# Altium schematic symbol library TI Power Management Shunt Voltage Reference.SchLib: 1526 symbols (part 1 of 18) (continued)
## LM336DE4-2-5
designator U?
Integrated Reference Circuit, 2.5 V, 10 ppm / degC, 10 mA, 0 to 70 degC, 8-pin SOIC (D), Green (RoHS & no Sb/Br); Manufacturer: Texas Instruments; PartNumber: LM336DE4-2-5; Initial Accuracy @ 25/deg C(%): 4; Iout/Iz(Max)(mA): 10; Min Iz for Regulation(uA): 400; Rating: Catalog; SubFamily: Shunt Voltage Reference; Temp Coeff(Max)(ppm/ degree C): 34; VO(V): 2.49; DatasheetVersion: SLVS063E; PackageVersion: 4040047-3/M; PackageReference: D8; PackageDescription: 8-Pin Plastic Small Outline, Body 4.9 x 3.9 mm, Pitch 1.27 mm; Supplier 1: Digi-Key; Supplier Part Number 1: LM336DE4-2-5-ND; Supplier 2: Mouser; Supplier Part Number 2: 595-LM336DE4-2-5; Eco-Plan: Green (RoHS & no Sb/Br); Temp Coeff(Typ)(ppm/ degree C): 10; Mounting Technology: Surface Mount; Code_JEDEC: MS-012; ComponentLink1Description: Manufacturer URL; ComponentLink1URL: http://www.ti.com/; ComponentLink2Description: Datasheet; ComponentLink2URL: http://www.ti.com/general/docs/lit/getliterature.tsp?genericPartNumber=LM336-2.5&fileType=pdf; ComponentLink3Description: Package Specification; ComponentLink3URL: http://www.ti.com/litv/pdf/msoi002j
footprint TI-D8_N (SOIC, 8-Leads, Body 4.9x3.9mm, Pitch 1.27mm, IPC Medium Density)
part A pins: 4 ANODE, 5 ADJ (in), 8 CATHODE
part B pins: 1 NC "No internal connection", 2 NC "No internal connection", 3 NC "No internal connection", 6 NC "No internal connection", 7 NC "No internal connection"

## LM336DG4-2-5
designator U?
Integrated Reference Circuit, 2.5 V, 10 ppm / degC, 10 mA, 0 to 70 degC, 8-pin SOIC (D), Green (RoHS & no Sb/Br); Manufacturer: Texas Instruments; PartNumber: LM336DG4-2-5; Initial Accuracy @ 25/deg C(%): 4; Iout/Iz(Max)(mA): 10; Min Iz for Regulation(uA): 400; Rating: Catalog; SubFamily: Shunt Voltage Reference; Temp Coeff(Max)(ppm/ degree C): 34; VO(V): 2.49; DatasheetVersion: SLVS063E; PackageVersion: 4040047-3/M; PackageReference: D8; PackageDescription: 8-Pin Plastic Small Outline, Body 4.9 x 3.9 mm, Pitch 1.27 mm; Supplier 1: Digi-Key; Supplier Part Number 1: LM336DG4-2-5-ND; Supplier 2: Newark; Supplier Part Number 2: 41M3419; Supplier 3: Mouser; Supplier Part Number 3: 595-LM336DG4-2-5; Eco-Plan: Green (RoHS & no Sb/Br); Temp Coeff(Typ)(ppm/ degree C): 10; Mounting Technology: Surface Mount; Code_JEDEC: MS-012; ComponentLink1Description: Manufacturer URL; ComponentLink1URL: http://www.ti.com/; ComponentLink2Description: Datasheet; ComponentLink2URL: http://www.ti.com/general/docs/lit/getliterature.tsp?genericPartNumber=LM336-2.5&fileType=pdf; ComponentLink3Description: Package Specification; ComponentLink3URL: http://www.ti.com/litv/pdf/msoi002j
footprint TI-D8_N (SOIC, 8-Leads, Body 4.9x3.9mm, Pitch 1.27mm, IPC Medium Density)
part A pins: 4 ANODE, 5 ADJ (in), 8 CATHODE
part B pins: 1 NC "No internal connection", 2 NC "No internal connection", 3 NC "No internal connection", 6 NC "No internal connection", 7 NC "No internal connection"

## LM336DR-2-5
designator U?
Integrated Reference Circuit, 2.5 V, 10 ppm / degC, 10 mA, 0 to 70 degC, 8-pin SOIC (D), Green (RoHS & no Sb/Br); Manufacturer: Texas Instruments; PartNumber: LM336DR-2-5; Initial Accuracy @ 25/deg C(%): 4; Iout/Iz(Max)(mA): 10; Min Iz for Regulation(uA): 400; Rating: Catalog; SubFamily: Shunt Voltage Reference; Temp Coeff(Max)(ppm/ degree C): 34; VO(V): 2.49; DatasheetVersion: SLVS063E; PackageVersion: 4040047-3/M; PackageReference: D8; PackageDescription: 8-Pin Plastic Small Outline, Body 4.9 x 3.9 mm, Pitch 1.27 mm; Supplier 1: Digi-Key; Supplier Part Number 1: LM336DR-2-5-ND; Supplier 2: Mouser; Supplier Part Number 2: 595-LM336DR-2-5; Eco-Plan: Green (RoHS & no Sb/Br); Temp Coeff(Typ)(ppm/ degree C): 10; Mounting Technology: Surface Mount; Code_JEDEC: MS-012; ComponentLink1Description: Manufacturer URL; ComponentLink1URL: http://www.ti.com/; ComponentLink2Description: Datasheet; ComponentLink2URL: http://www.ti.com/general/docs/lit/getliterature.tsp?genericPartNumber=LM336-2.5&fileType=pdf; ComponentLink3Description: Package Specification; ComponentLink3URL: http://www.ti.com/litv/pdf/msoi002j
footprint TI-D8_N (SOIC, 8-Leads, Body 4.9x3.9mm, Pitch 1.27mm, IPC Medium Density)
part A pins: 4 ANODE, 5 ADJ (in), 8 CATHODE
part B pins: 1 NC "No internal connection", 2 NC "No internal connection", 3 NC "No internal connection", 6 NC "No internal connection", 7 NC "No internal connection"

## LM336DRE4-2-5
designator U?
Integrated Reference Circuit, 2.5 V, 10 ppm / degC, 10 mA, 0 to 70 degC, 8-pin SOIC (D), Green (RoHS & no Sb/Br); Manufacturer: Texas Instruments; PartNumber: LM336DRE4-2-5; Initial Accuracy @ 25/deg C(%): 4; Iout/Iz(Max)(mA): 10; Min Iz for Regulation(uA): 400; Rating: Catalog; SubFamily: Shunt Voltage Reference; Temp Coeff(Max)(ppm/ degree C): 34; VO(V): 2.49; DatasheetVersion: SLVS063E; PackageVersion: 4040047-3/M; PackageReference: D8; PackageDescription: 8-Pin Plastic Small Outline, Body 4.9 x 3.9 mm, Pitch 1.27 mm; Supplier 1: Digi-Key; Supplier Part Number 1: LM336DRE4-2-5-ND; Supplier 2: Mouser; Supplier Part Number 2: 595-LM336DRE4-2-5; Eco-Plan: Green (RoHS & no Sb/Br); Temp Coeff(Typ)(ppm/ degree C): 10; Mounting Technology: Surface Mount; Code_JEDEC: MS-012; ComponentLink1Description: Manufacturer URL; ComponentLink1URL: http://www.ti.com/; ComponentLink2Description: Datasheet; ComponentLink2URL: http://www.ti.com/general/docs/lit/getliterature.tsp?genericPartNumber=LM336-2.5&fileType=pdf; ComponentLink3Description: Package Specification; ComponentLink3URL: http://www.ti.com/litv/pdf/msoi002j
footprint TI-D8_N (SOIC, 8-Leads, Body 4.9x3.9mm, Pitch 1.27mm, IPC Medium Density)
part A pins: 4 ANODE, 5 ADJ (in), 8 CATHODE
part B pins: 1 NC "No internal connection", 2 NC "No internal connection", 3 NC "No internal connection", 6 NC "No internal connection", 7 NC "No internal connection"

## LM336DRG4-2-5
designator U?
Integrated Reference Circuit, 2.5 V, 10 ppm / degC, 10 mA, 0 to 70 degC, 8-pin SOIC (D), Green (RoHS & no Sb/Br); Manufacturer: Texas Instruments; PartNumber: LM336DRG4-2-5; Initial Accuracy @ 25/deg C(%): 4; Iout/Iz(Max)(mA): 10; Min Iz for Regulation(uA): 400; Rating: Catalog; SubFamily: Shunt Voltage Reference; Temp Coeff(Max)(ppm/ degree C): 34; VO(V): 2.49; DatasheetVersion: SLVS063E; PackageVersion: 4040047-3/M; PackageReference: D8; PackageDescription: 8-Pin Plastic Small Outline, Body 4.9 x 3.9 mm, Pitch 1.27 mm; Supplier 1: Digi-Key; Supplier Part Number 1: LM336DRG4-2-5-ND; Supplier 2: Newark; Supplier Part Number 2: 41M3420; Supplier 3: Mouser; Supplier Part Number 3: 595-LM336DRG4-2-5; Eco-Plan: Green (RoHS & no Sb/Br); Temp Coeff(Typ)(ppm/ degree C): 10; Mounting Technology: Surface Mount; Code_JEDEC: MS-012; ComponentLink1Description: Manufacturer URL; ComponentLink1URL: http://www.ti.com/; ComponentLink2Description: Datasheet; ComponentLink2URL: http://www.ti.com/general/docs/lit/getliterature.tsp?genericPartNumber=LM336-2.5&fileType=pdf; ComponentLink3Description: Package Specification; ComponentLink3URL: http://www.ti.com/litv/pdf/msoi002j
footprint TI-D8_N (SOIC, 8-Leads, Body 4.9x3.9mm, Pitch 1.27mm, IPC Medium Density)
part A pins: 4 ANODE, 5 ADJ (in), 8 CATHODE
part B pins: 1 NC "No internal connection", 2 NC "No internal connection", 3 NC "No internal connection", 6 NC "No internal connection", 7 NC "No internal connection"

## LM336LP-2-5
designator U?
Integrated Reference Circuit, 2.5-V, 10 ppm / degC, 10 mA, 0 to 70 degC, 3-pin TO-92 (LP), Pb-Free (RoHS); Manufacturer: Texas Instruments; PartNumber: LM336LP-2-5; Initial Accuracy @ 25/deg C(%): 4; Iout/Iz(Max)(mA): 10; Min Iz for Regulation(uA): 400; Rating: Catalog; SubFamily: Shunt Voltage Reference; Temp Coeff(Max)(ppm/ degree C): 34; VO(V): 2.49; DatasheetVersion: SLVS063E; PackageVersion: 4040001-2/C; PackageReference: LP3; PackageDescription: Plastic Cylindrical Package, Formed Lead Option (TO-92); Supplier 1: Digi-Key; Supplier Part Number 1: 296-31365-ND; Supplier 2: Newark; Supplier Part Number 2: 06F9356; Supplier 3: Mouser; Supplier Part Number 3: 595-LM336LP-2-5; Eco-Plan: Pb-Free (RoHS); Temp Coeff(Typ)(ppm/ degree C): 10; Mounting Technology: Through Hole; Code_JEDEC: TO-226; ComponentLink1Description: Manufacturer URL; ComponentLink1URL: http://www.ti.com/; ComponentLink2Description: Datasheet; ComponentLink2URL: http://www.ti.com/general/docs/lit/getliterature.tsp?genericPartNumber=LM336-2.5&fileType=pdf; ComponentLink3Description: Package Specification; ComponentLink3URL: http://www.ti.com/litv/pdf/msot002a
footprint TI-LP3 (TO, Flat Index; 3 In-Line, Formed Axial Leads; Body Dia. 4.8mm; Leads 0.56 x 0.41 mm (max))
pins: 1 ADJ (in), 2 CATHODE, 3 ANODE

## LM336LPE3-2-5
designator U?
Integrated Reference Circuit, 2.49 V, 10 ppm / degC, 10 mA, 0 to 70 degC, 3-pin TO-92 (LP), Pb-Free (RoHS); Manufacturer: Texas Instruments; PartNumber: LM336LPE3-2-5; Initial Accuracy @ 25/deg C(%): 4; Iout/Iz(Max)(mA): 10; Min Iz for Regulation(uA): 400; Rating: Catalog; SubFamily: Shunt Voltage Reference; Temp Coeff(Max)(ppm/ degree C): 34; VO(V): 2.49; DatasheetVersion: SLVS063E; PackageVersion: 4040001-2/C; PackageReference: LP3; PackageDescription: Plastic Cylindrical Package, Formed Lead Option (TO-92); Supplier 1: Digi-Key; Supplier Part Number 1: LM336LPE3-2-5-ND; Supplier 2: Mouser; Supplier Part Number 2: 595-LM336LPE3-2-5; Eco-Plan: Pb-Free (RoHS); Temp Coeff(Typ)(ppm/ degree C): 10; Mounting Technology: Through Hole; Code_JEDEC: TO-226; ComponentLink1Description: Manufacturer URL; ComponentLink1URL: http://www.ti.com/; ComponentLink2Description: Datasheet; ComponentLink2URL: http://www.ti.com/general/docs/lit/getliterature.tsp?genericPartNumber=LM336-2.5&fileType=pdf; ComponentLink3Description: Package Specification; ComponentLink3URL: http://www.ti.com/litv/pdf/msot002a
footprint TI-LP3 (TO, Flat Index; 3 In-Line, Formed Axial Leads; Body Dia. 4.8mm; Leads 0.56 x 0.41 mm (max))
pins: 1 ADJ (in), 2 CATHODE, 3 ANODE

## LM336LPR-2-5
designator U?
Integrated Reference Circuit, 2.5 V, 10 ppm / degC, 10 mA, 0 to 70 degC, 3-pin TO-92 (LP), Pb-Free (RoHS); Manufacturer: Texas Instruments; PartNumber: LM336LPR-2-5; Iout/Iz(Max)(mA): 10; Min Iz for Regulation(uA): 400; Rating: Catalog; SubFamily: Shunt Voltage Reference; Temp Coeff(Max)(ppm/ degree C): 34; DatasheetVersion: SLVS063E; PackageVersion: 4040001-2/C; PackageReference: LP3; PackageDescription: Plastic Cylindrical Package, Formed Lead Option (TO-92); Supplier 1: Digi-Key; Supplier Part Number 1: LM336LPR-2-5-ND; Supplier 2: Newark; Supplier Part Number 2: 82H4040; Supplier 3: Mouser; Supplier Part Number 3: 595-LM336LPR-2-5; Eco-Plan: Pb-Free (RoHS); Temp Coeff(Typ)(ppm/ degree C): 10; Mounting Technology: Through Hole; Code_JEDEC: TO-226; ComponentLink1Description: Manufacturer URL; ComponentLink1URL: http://www.ti.com/; ComponentLink2Description: Datasheet; ComponentLink2URL: http://www.ti.com/general/docs/lit/getliterature.tsp?genericPartNumber=LM336-2.5&fileType=pdf; ComponentLink3Description: Package Specification; ComponentLink3URL: http://www.ti.com/litv/pdf/msot002a
footprint TI-LP3 (TO, Flat Index; 3 In-Line, Formed Axial Leads; Body Dia. 4.8mm; Leads 0.56 x 0.41 mm (max))
pins: 1 ADJ (in), 2 CATHODE, 3 ANODE

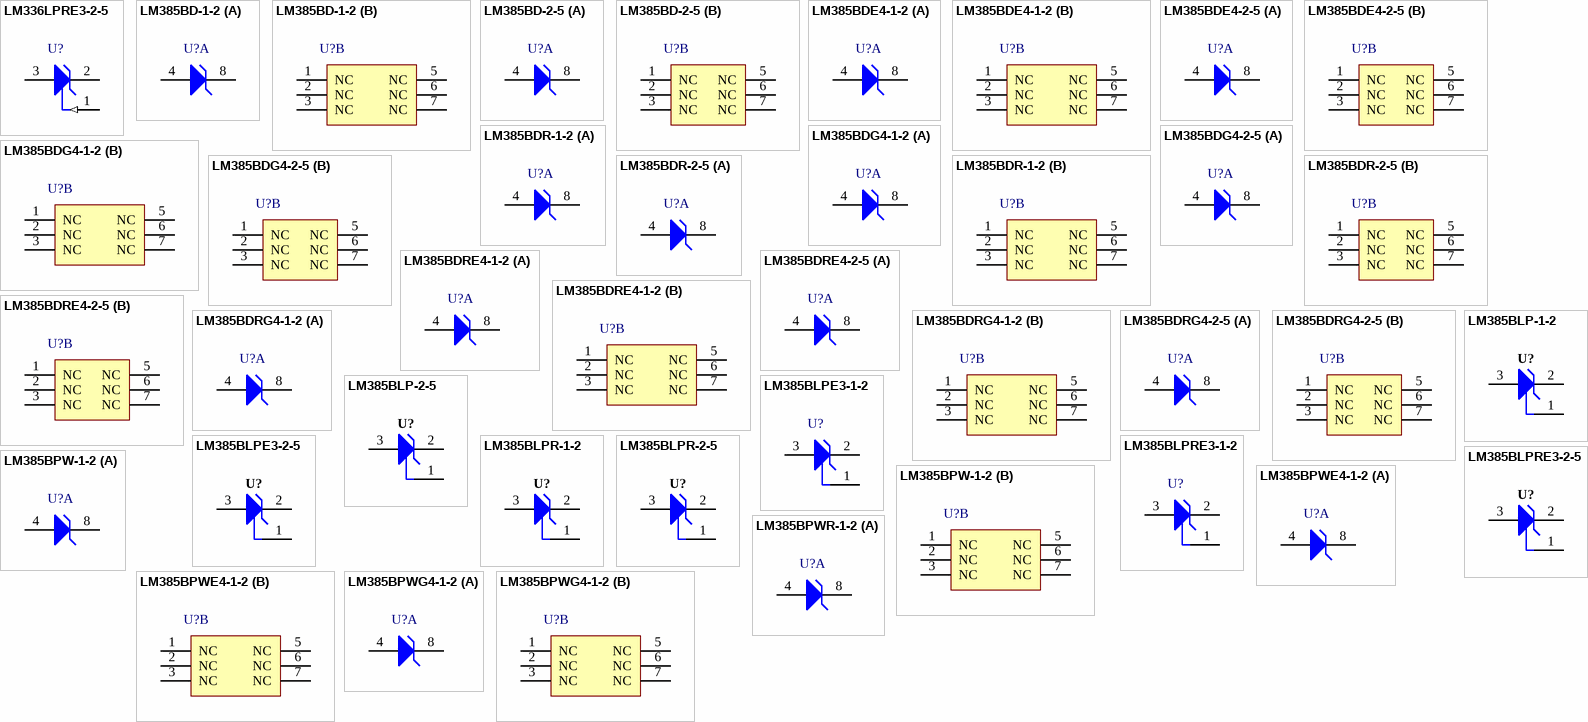
[diagram p2: symbols LM336LPRE3-2-5 to LM385BPWR-1-2]

## LM336LPRE3-2-5
designator U?
Integrated Reference Circuit, 2.5 V, 10 ppm / degC, 10 mA, 0 to 70 degC, 3-pin TO-92 (LP), Pb-Free (RoHS); Manufacturer: Texas Instruments; PartNumber: LM336LPRE3-2-5; Iout/Iz(Max)(mA): 10; Min Iz for Regulation(uA): 400; Rating: Catalog; SubFamily: Shunt Voltage Reference; Temp Coeff(Max)(ppm/ degree C): 34; DatasheetVersion: SLVS063E; PackageVersion: 4040001-2/C; PackageReference: LP3; PackageDescription: Plastic Cylindrical Package, Formed Lead Option (TO-92); Supplier 1: Digi-Key; Supplier Part Number 1: LM336LPRE3-2-5-ND; Supplier 2: Mouser; Supplier Part Number 2: 595-LM336LPRE3-2-5; Eco-Plan: Pb-Free (RoHS); Temp Coeff(Typ)(ppm/ degree C): 10; Mounting Technology: Through Hole; Code_JEDEC: TO-226; ComponentLink1Description: Manufacturer URL; ComponentLink1URL: http://www.ti.com/; ComponentLink2Description: Datasheet; ComponentLink2URL: http://www.ti.com/general/docs/lit/getliterature.tsp?genericPartNumber=LM336-2.5&fileType=pdf; ComponentLink3Description: Package Specification; ComponentLink3URL: http://www.ti.com/litv/pdf/msot002a
footprint TI-LP3 (TO, Flat Index; 3 In-Line, Formed Axial Leads; Body Dia. 4.8mm; Leads 0.56 x 0.41 mm (max))
pins: 1 ADJ (in), 2 CATHODE, 3 ANODE

## LM385BD-1-2
designator U?
Micropower Voltage Reference, 20 ppm / degC, 20 mA, 0 to 70 degC, 8-pin SOIC (D), Green (RoHS & no Sb/Br); Manufacturer: Texas Instruments; PartNumber: LM385BD-1-2; Initial Accuracy @ 25/deg C(%): 1; Iout/Iz(Max)(mA): 20; Min Iz for Regulation(uA): 10; Rating: Catalog; SubFamily: Shunt Voltage Reference; VO(V): 1.235; DatasheetVersion: SLVS075I; PackageVersion: 4040047-3/M; PackageReference: D8; PackageDescription: 8-Pin Plastic Small Outline, Body 4.9 x 3.9 mm, Pitch 1.27 mm; Supplier 1: Digi-Key; Supplier Part Number 1: 296-9556-5-ND; Supplier 2: Farnell; Supplier Part Number 2: 1459236; Supplier 3: Newark; Supplier Part Number 3: 06F9432; Supplier 4: Mouser; Supplier Part Number 4: 595-LM385BD-1-2; Eco-Plan: Green (RoHS & no Sb/Br); Temp Coeff(Typ)(ppm/ degree C): 20; Mounting Technology: Surface Mount; Code_JEDEC: MS-012; ComponentLink1Description: Manufacturer URL; ComponentLink1URL: http://www.ti.com/; ComponentLink2Description: Datasheet; ComponentLink2URL: http://www.ti.com/general/docs/lit/getliterature.tsp?genericPartNumber=LM385B-1.2&fileType=pdf; ComponentLink3Description: Package Specification; ComponentLink3URL: http://www.ti.com/litv/pdf/msoi002j
footprint TI-D8_N (SOIC, 8-Leads, Body 4.9x3.9mm, Pitch 1.27mm, IPC Medium Density)
part A pins: 4 ANODE, 8 CATHODE
part B pins: 1 NC "No internal connection", 2 NC "No internal connection", 3 NC "No internal connection", 5 NC "No internal connection", 6 NC "No internal connection", 7 NC "No internal connection"

## LM385BD-2-5
designator U?
Micropower Voltage Reference, 2.5 V, 20 ppm / degC, 20 mA, 0 to 70 degC, 8-pin SOIC (D), Green (RoHS & no Sb/Br); Manufacturer: Texas Instruments; PartNumber: LM385BD-2-5; Initial Accuracy @ 25/deg C(%): 1.5; Iout/Iz(Max)(mA): 20; Rating: Catalog; SubFamily: Shunt Voltage Reference; VO(V): 2.5; DatasheetVersion: SLVS023J; PackageVersion: 4040047-3/M; PackageReference: D8; PackageDescription: 8-Pin Plastic Small Outline, Body 4.9 x 3.9 mm, Pitch 1.27 mm; Supplier 1: Digi-Key; Supplier Part Number 1: 296-9557-5-ND; Supplier 2: Farnell; Supplier Part Number 2: 1459237; Supplier 3: Newark; Supplier Part Number 3: 61M7450; Supplier 4: Newark; Supplier Part Number 4: 06F9434; Supplier 5: Mouser; Supplier Part Number 5: 595-LM385BD-2-5; Eco-Plan: Green (RoHS & no Sb/Br); Min Iz for Regulation(uA): 20; Temp Coeff(Typ)(ppm/ degree C): 20; Mounting Technology: Surface Mount; Code_JEDEC: MS-012; ComponentLink1Description: Manufacturer URL; ComponentLink1URL: http://www.ti.com/; ComponentLink2Description: Datasheet; ComponentLink2URL: http://www.ti.com/general/docs/lit/getliterature.tsp?genericPartNumber=LM385B-2.5&fileType=pdf; ComponentLink3Description: Package Specification; ComponentLink3URL: http://www.ti.com/litv/pdf/msoi002j
footprint TI-D8_N (SOIC, 8-Leads, Body 4.9x3.9mm, Pitch 1.27mm, IPC Medium Density)
part A pins: 4 ANODE, 8 CATHODE
part B pins: 1 NC "No internal connection", 2 NC "No internal connection", 3 NC "No internal connection", 5 NC "No internal connection", 6 NC "No internal connection", 7 NC "No internal connection"

## LM385BDE4-1-2
designator U?
Micropower Voltage Reference, 20 ppm / degC, 20 mA, 0 to 70 degC, 8-pin SOIC (D), Green (RoHS & no Sb/Br); Manufacturer: Texas Instruments; PartNumber: LM385BDE4-1-2; Initial Accuracy @ 25/deg C(%): 1; Iout/Iz(Max)(mA): 20; Min Iz for Regulation(uA): 10; Rating: Catalog; SubFamily: Shunt Voltage Reference; VO(V): 1.235; DatasheetVersion: SLVS075I; PackageVersion: 4040047-3/M; PackageReference: D8; PackageDescription: 8-Pin Plastic Small Outline, Body 4.9 x 3.9 mm, Pitch 1.27 mm; Supplier 1: Digi-Key; Supplier Part Number 1: LM385BDE4-1-2-ND; Supplier 2: Newark; Supplier Part Number 2: 37K0335; Supplier 3: Mouser; Supplier Part Number 3: 595-LM385BDE4-1-2; Eco-Plan: Green (RoHS & no Sb/Br); Temp Coeff(Typ)(ppm/ degree C): 20; Mounting Technology: Surface Mount; Code_JEDEC: MS-012; ComponentLink1Description: Manufacturer URL; ComponentLink1URL: http://www.ti.com/; ComponentLink2Description: Datasheet; ComponentLink2URL: http://www.ti.com/general/docs/lit/getliterature.tsp?genericPartNumber=LM385B-1.2&fileType=pdf; ComponentLink3Description: Package Specification; ComponentLink3URL: http://www.ti.com/litv/pdf/msoi002j
footprint TI-D8_N (SOIC, 8-Leads, Body 4.9x3.9mm, Pitch 1.27mm, IPC Medium Density)
part A pins: 4 ANODE, 8 CATHODE
part B pins: 1 NC "No internal connection", 2 NC "No internal connection", 3 NC "No internal connection", 5 NC "No internal connection", 6 NC "No internal connection", 7 NC "No internal connection"

## LM385BDE4-2-5
designator U?
Micropower Voltage Reference, 2.5 V, 20 ppm / degC, 20 mA, 0 to 70 degC, 8-pin SOIC (D), Green (RoHS & no Sb/Br); Manufacturer: Texas Instruments; PartNumber: LM385BDE4-2-5; Initial Accuracy @ 25/deg C(%): 1.5; Iout/Iz(Max)(mA): 20; Rating: Catalog; SubFamily: Shunt Voltage Reference; VO(V): 2.5; DatasheetVersion: SLVS023J; PackageVersion: 4040047-3/M; PackageReference: D8; PackageDescription: 8-Pin Plastic Small Outline, Body 4.9 x 3.9 mm, Pitch 1.27 mm; Supplier 1: Digi-Key; Supplier Part Number 1: LM385BDE4-2-5-ND; Supplier 2: Mouser; Supplier Part Number 2: 595-LM385BDE4-2-5; Eco-Plan: Green (RoHS & no Sb/Br); Min Iz for Regulation(uA): 20; Temp Coeff(Typ)(ppm/ degree C): 20; Mounting Technology: Surface Mount; Code_JEDEC: MS-012; ComponentLink1Description: Manufacturer URL; ComponentLink1URL: http://www.ti.com/; ComponentLink2Description: Datasheet; ComponentLink2URL: http://www.ti.com/general/docs/lit/getliterature.tsp?genericPartNumber=LM385B-2.5&fileType=pdf; ComponentLink3Description: Package Specification; ComponentLink3URL: http://www.ti.com/litv/pdf/msoi002j
footprint TI-D8_N (SOIC, 8-Leads, Body 4.9x3.9mm, Pitch 1.27mm, IPC Medium Density)
part A pins: 4 ANODE, 8 CATHODE
part B pins: 1 NC "No internal connection", 2 NC "No internal connection", 3 NC "No internal connection", 5 NC "No internal connection", 6 NC "No internal connection", 7 NC "No internal connection"

## LM385BDG4-1-2
designator U?
Micropower Voltage Reference, 20 ppm / degC, 20 mA, 0 to 70 degC, 8-pin SOIC (D), Green (RoHS & no Sb/Br); Manufacturer: Texas Instruments; PartNumber: LM385BDG4-1-2; Initial Accuracy @ 25/deg C(%): 1; Iout/Iz(Max)(mA): 20; Min Iz for Regulation(uA): 10; Rating: Catalog; SubFamily: Shunt Voltage Reference; VO(V): 1.235; DatasheetVersion: SLVS075I; PackageVersion: 4040047-3/M; PackageReference: D8; PackageDescription: 8-Pin Plastic Small Outline, Body 4.9 x 3.9 mm, Pitch 1.27 mm; Supplier 1: Digi-Key; Supplier Part Number 1: LM385BDG4-1-2-ND; Supplier 2: Newark; Supplier Part Number 2: 41M3421; Supplier 3: Mouser; Supplier Part Number 3: 595-LM385BDG4-1-2; Eco-Plan: Green (RoHS & no Sb/Br); Temp Coeff(Typ)(ppm/ degree C): 20; Mounting Technology: Surface Mount; Code_JEDEC: MS-012; ComponentLink1Description: Manufacturer URL; ComponentLink1URL: http://www.ti.com/; ComponentLink2Description: Datasheet; ComponentLink2URL: http://www.ti.com/general/docs/lit/getliterature.tsp?genericPartNumber=LM385B-1.2&fileType=pdf; ComponentLink3Description: Package Specification; ComponentLink3URL: http://www.ti.com/litv/pdf/msoi002j
footprint TI-D8_N (SOIC, 8-Leads, Body 4.9x3.9mm, Pitch 1.27mm, IPC Medium Density)
part A pins: 4 ANODE, 8 CATHODE
part B pins: 1 NC "No internal connection", 2 NC "No internal connection", 3 NC "No internal connection", 5 NC "No internal connection", 6 NC "No internal connection", 7 NC "No internal connection"

## LM385BDG4-2-5
designator U?
Micropower Voltage Reference, 2.5 V, 20 ppm / degC, 20 mA, 0 to 70 degC, 8-pin SOIC (D), Green (RoHS & no Sb/Br); Manufacturer: Texas Instruments; PartNumber: LM385BDG4-2-5; Initial Accuracy @ 25/deg C(%): 1.5; Iout/Iz(Max)(mA): 20; Rating: Catalog; SubFamily: Shunt Voltage Reference; VO(V): 2.5; DatasheetVersion: SLVS023J; PackageVersion: 4040047-3/M; PackageReference: D8; PackageDescription: 8-Pin Plastic Small Outline, Body 4.9 x 3.9 mm, Pitch 1.27 mm; Supplier 1: Digi-Key; Supplier Part Number 1: LM385BDG4-2-5-ND; Supplier 2: Newark; Supplier Part Number 2: 41M3422; Supplier 3: Mouser; Supplier Part Number 3: 595-LM385BDG4-2-5; Eco-Plan: Green (RoHS & no Sb/Br); Min Iz for Regulation(uA): 20; Temp Coeff(Typ)(ppm/ degree C): 20; Mounting Technology: Surface Mount; Code_JEDEC: MS-012; ComponentLink1Description: Manufacturer URL; ComponentLink1URL: http://www.ti.com/; ComponentLink2Description: Datasheet; ComponentLink2URL: http://www.ti.com/general/docs/lit/getliterature.tsp?genericPartNumber=LM385B-2.5&fileType=pdf; ComponentLink3Description: Package Specification; ComponentLink3URL: http://www.ti.com/litv/pdf/msoi002j
footprint TI-D8_N (SOIC, 8-Leads, Body 4.9x3.9mm, Pitch 1.27mm, IPC Medium Density)
part A pins: 4 ANODE, 8 CATHODE
part B pins: 1 NC "No internal connection", 2 NC "No internal connection", 3 NC "No internal connection", 5 NC "No internal connection", 6 NC "No internal connection", 7 NC "No internal connection"

## LM385BDR-1-2
designator U?
Micropower Voltage Reference, 1.235 V, 20 ppm / degC, 20 mA, 0 to 70 degC, 8-pin SOIC (D), Green (RoHS & no Sb/Br); Manufacturer: Texas Instruments; PartNumber: LM385BDR-1-2; Initial Accuracy @ 25/deg C(%): 1; Iout/Iz(Max)(mA): 20; Min Iz for Regulation(uA): 10; Rating: Catalog; SubFamily: Shunt Voltage Reference; VO(V): 1.235; DatasheetVersion: SLVS075I; PackageVersion: 4040047-3/M; PackageReference: D8; PackageDescription: 8-Pin Plastic Small Outline, Body 4.9 x 3.9 mm, Pitch 1.27 mm; Supplier 1: Digi-Key; Supplier Part Number 1: 296-14603-2-ND; Supplier 2: Digi-Key; Supplier Part Number 2: 296-14603-1-ND; Supplier 3: Digi-Key; Supplier Part Number 3: 296-14603-6-ND; Supplier 4: Newark; Supplier Part Number 4: 20C4063; Supplier 5: Mouser; Supplier Part Number 5: 595-LM385BDR-1-2; Eco-Plan: Green (RoHS & no Sb/Br); Temp Coeff(Typ)(ppm/ degree C): 20; Mounting Technology: Surface Mount; Code_JEDEC: MS-012; ComponentLink1Description: Manufacturer URL; ComponentLink1URL: http://www.ti.com/; ComponentLink2Description: Datasheet; ComponentLink2URL: http://www.ti.com/general/docs/lit/getliterature.tsp?genericPartNumber=LM385B-1.2&fileType=pdf; ComponentLink3Description: Package Specification; ComponentLink3URL: http://www.ti.com/litv/pdf/msoi002j
footprint TI-D8_N (SOIC, 8-Leads, Body 4.9x3.9mm, Pitch 1.27mm, IPC Medium Density)
part A pins: 4 ANODE, 8 CATHODE
part B pins: 1 NC "No internal connection", 2 NC "No internal connection", 3 NC "No internal connection", 5 NC "No internal connection", 6 NC "No internal connection", 7 NC "No internal connection"

## LM385BDR-2-5
designator U?
Micropower Voltage Reference, 2.5 V, 20 ppm / degC, 20 mA, 0 to 70 degC, 8-pin SOIC (D), Green (RoHS & no Sb/Br); Manufacturer: Texas Instruments; PartNumber: LM385BDR-2-5; Initial Accuracy @ 25/deg C(%): 1.5; Iout/Iz(Max)(mA): 20; Rating: Catalog; SubFamily: Shunt Voltage Reference; VO(V): 2.5; DatasheetVersion: SLVS023J; PackageVersion: 4040047-3/M; PackageReference: D8; PackageDescription: 8-Pin Plastic Small Outline, Body 4.9 x 3.9 mm, Pitch 1.27 mm; Supplier 1: Digi-Key; Supplier Part Number 1: 296-26103-2-ND; Supplier 2: Digi-Key; Supplier Part Number 2: 296-26103-1-ND; Supplier 3: Digi-Key; Supplier Part Number 3: 296-26103-6-ND; Supplier 4: Newark; Supplier Part Number 4: 29C8235; Supplier 5: Mouser; Supplier Part Number 5: 595-LM385BDR-2-5; Eco-Plan: Green (RoHS & no Sb/Br); Min Iz for Regulation(uA): 20; Temp Coeff(Typ)(ppm/ degree C): 20; Mounting Technology: Surface Mount; Code_JEDEC: MS-012; ComponentLink1Description: Manufacturer URL; ComponentLink1URL: http://www.ti.com/; ComponentLink2Description: Datasheet; ComponentLink2URL: http://www.ti.com/general/docs/lit/getliterature.tsp?genericPartNumber=LM385B-2.5&fileType=pdf; ComponentLink3Description: Package Specification; ComponentLink3URL: http://www.ti.com/litv/pdf/msoi002j
footprint TI-D8_N (SOIC, 8-Leads, Body 4.9x3.9mm, Pitch 1.27mm, IPC Medium Density)
part A pins: 4 ANODE, 8 CATHODE
part B pins: 1 NC "No internal connection", 2 NC "No internal connection", 3 NC "No internal connection", 5 NC "No internal connection", 6 NC "No internal connection", 7 NC "No internal connection"

## LM385BDRE4-1-2
designator U?
Micropower Voltage Reference, 1.235 V, 20 ppm / degC, 20 mA, 0 to 70 degC, 8-pin SOIC (D), Green (RoHS & no Sb/Br); Manufacturer: Texas Instruments; PartNumber: LM385BDRE4-1-2; Initial Accuracy @ 25/deg C(%): 1; Iout/Iz(Max)(mA): 20; Min Iz for Regulation(uA): 10; Rating: Catalog; SubFamily: Shunt Voltage Reference; VO Adj(Max)(V): 1.247; VO Adj(Min)(V): 1.223; VO(V): 1.235; DatasheetVersion: SLVS075I; PackageVersion: 4040047-3/M; PackageReference: D8; PackageDescription: 8-Pin Plastic Small Outline, Body 4.9 x 3.9 mm, Pitch 1.27 mm; Supplier 1: Digi-Key; Supplier Part Number 1: LM385BDRE4-1-2-ND; Supplier 2: Mouser; Supplier Part Number 2: 595-LM385BDRE4-1-2; Eco-Plan: Green (RoHS & no Sb/Br); Temp Coeff(Typ)(ppm/ degree C): 20; Mounting Technology: Surface Mount; Code_JEDEC: MS-012; ComponentLink1Description: Manufacturer URL; ComponentLink1URL: http://www.ti.com/; ComponentLink2Description: Datasheet; ComponentLink2URL: http://www.ti.com/general/docs/lit/getliterature.tsp?genericPartNumber=LM385B-1.2&fileType=pdf; ComponentLink3Description: Package Specification; ComponentLink3URL: http://www.ti.com/litv/pdf/msoi002j
footprint TI-D8_N (SOIC, 8-Leads, Body 4.9x3.9mm, Pitch 1.27mm, IPC Medium Density)
part A pins: 4 ANODE, 8 CATHODE
part B pins: 1 NC "No internal connection", 2 NC "No internal connection", 3 NC "No internal connection", 5 NC "No internal connection", 6 NC "No internal connection", 7 NC "No internal connection"

## LM385BDRE4-2-5
designator U?
Micropower Voltage Reference, 2.5 V, 20 ppm / degC, 20 mA, 0 to 70 degC, 8-pin SOIC (D), Green (RoHS & no Sb/Br); Manufacturer: Texas Instruments; PartNumber: LM385BDRE4-2-5; Initial Accuracy @ 25/deg C(%): 1.5; Iout/Iz(Max)(mA): 20; Rating: Catalog; SubFamily: Shunt Voltage Reference; VO(V): 2.5; DatasheetVersion: SLVS023J; PackageVersion: 4040047-3/M; PackageReference: D8; PackageDescription: 8-Pin Plastic Small Outline, Body 4.9 x 3.9 mm, Pitch 1.27 mm; Supplier 1: Digi-Key; Supplier Part Number 1: LM385BDRE4-2-5-ND; Supplier 2: Newark; Supplier Part Number 2: 37K0337; Supplier 3: Mouser; Supplier Part Number 3: 595-LM385BDRE4-2-5; Eco-Plan: Green (RoHS & no Sb/Br); Min Iz for Regulation(uA): 20; Temp Coeff(Typ)(ppm/ degree C): 20; Mounting Technology: Surface Mount; Code_JEDEC: MS-012; ComponentLink1Description: Manufacturer URL; ComponentLink1URL: http://www.ti.com/; ComponentLink2Description: Datasheet; ComponentLink2URL: http://www.ti.com/general/docs/lit/getliterature.tsp?genericPartNumber=LM385B-2.5&fileType=pdf; ComponentLink3Description: Package Specification; ComponentLink3URL: http://www.ti.com/litv/pdf/msoi002j
footprint TI-D8_N (SOIC, 8-Leads, Body 4.9x3.9mm, Pitch 1.27mm, IPC Medium Density)
part A pins: 4 ANODE, 8 CATHODE
part B pins: 1 NC "No internal connection", 2 NC "No internal connection", 3 NC "No internal connection", 5 NC "No internal connection", 6 NC "No internal connection", 7 NC "No internal connection"

## LM385BDRG4-1-2
designator U?
Micropower Voltage Reference, 1.235 V, 20 ppm / degC, 20 mA, 0 to 70 degC, 8-pin SOIC (D), Green (RoHS & no Sb/Br); Manufacturer: Texas Instruments; PartNumber: LM385BDRG4-1-2; Initial Accuracy @ 25/deg C(%): 1; Iout/Iz(Max)(mA): 20; Min Iz for Regulation(uA): 10; Rating: Catalog; SubFamily: Shunt Voltage Reference; VO(V): 1.235; DatasheetVersion: SLVS075I; PackageVersion: 4040047-3/M; PackageReference: D8; PackageDescription: 8-Pin Plastic Small Outline, Body 4.9 x 3.9 mm, Pitch 1.27 mm; Supplier 1: Digi-Key; Supplier Part Number 1: LM385BDRG4-1-2-ND; Supplier 2: Mouser; Supplier Part Number 2: 595-LM385BDRG4-1-2; Eco-Plan: Green (RoHS & no Sb/Br); Temp Coeff(Typ)(ppm/ degree C): 20; Mounting Technology: Surface Mount; Code_JEDEC: MS-012; ComponentLink1Description: Manufacturer URL; ComponentLink1URL: http://www.ti.com/; ComponentLink2Description: Datasheet; ComponentLink2URL: http://www.ti.com/general/docs/lit/getliterature.tsp?genericPartNumber=LM385B-1.2&fileType=pdf; ComponentLink3Description: Package Specification; ComponentLink3URL: http://www.ti.com/litv/pdf/msoi002j
footprint TI-D8_N (SOIC, 8-Leads, Body 4.9x3.9mm, Pitch 1.27mm, IPC Medium Density)
part A pins: 4 ANODE, 8 CATHODE
part B pins: 1 NC "No internal connection", 2 NC "No internal connection", 3 NC "No internal connection", 5 NC "No internal connection", 6 NC "No internal connection", 7 NC "No internal connection"
